# Altium footprint library std-th.PcbLib: 245 footprints (part 12 of 16)
Each footprint in its own frame and in the unit in brackets; x right, y up, seen from the top. Pads: shape width x height; smd on the part's side, far side on the other; paste and mask are expansions set on the pad; w line width, h text height; cw(c..) or ccw(c..) is an arc to the next point about the centre after c.
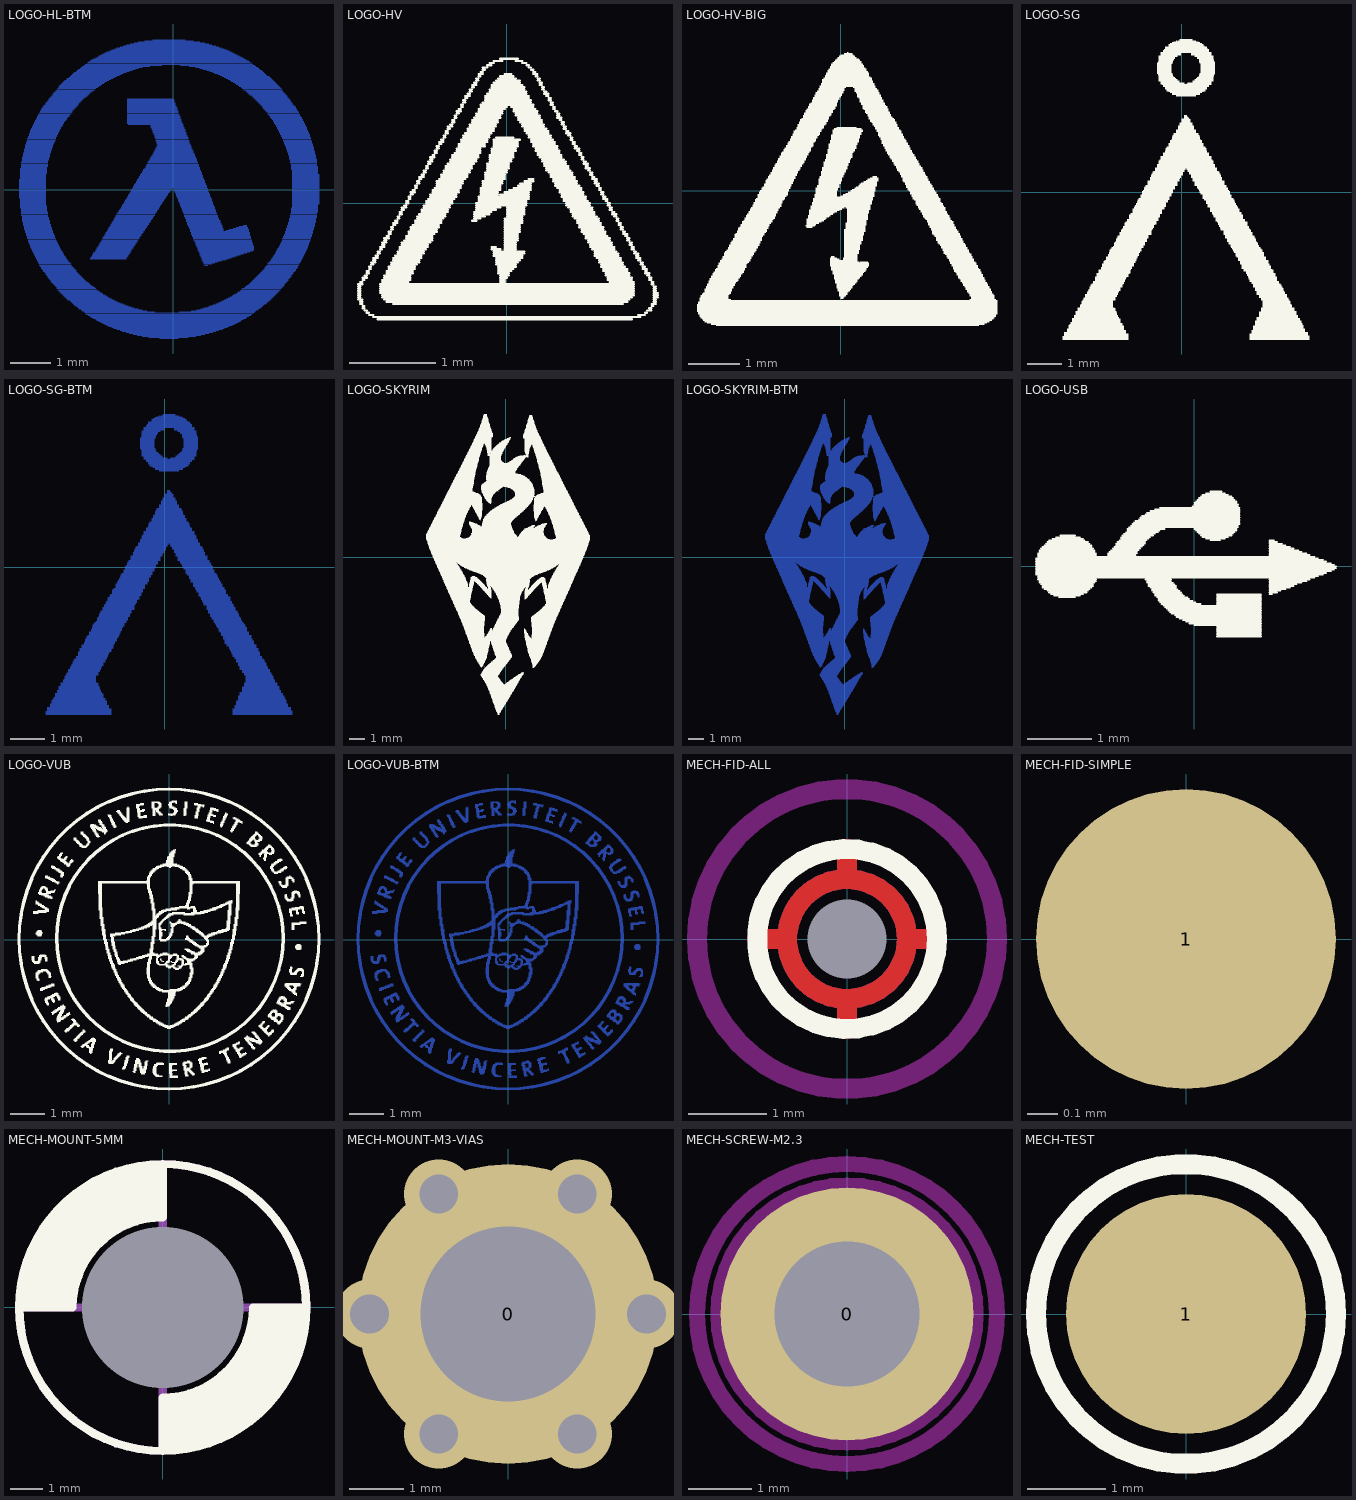
[diagram p11: the footprints below, top view; thin cyan lines are the x and y axes]

## LOGO-HL-BTM [mil] "Half Life Logo, 300 mil"
Bottom Layer:
  lines w1: -151,-8 -125,-8 ; -151,-7 -125,-7 ; -151,-6 -125,-6 ; -151,-5 -125,-5 ; -151,-4 -125,-4 ; -151,-3 -125,-3 ; -151,-2 -125,-2 ; -151,-1 -125,-1 ; -151,0 -125,0 ; -151,1 -125,1 ; -151,2 -125,2 ; -151,3 -125,3 ; -151,4 -125,4 ; -151,5 -125,5 ; -151,6 -125,6 ; -151,7 -125,7 ; -151,8 -125,8 ; -151,9 -125,9 ; -151,10 -125,10 ; -150,-18 -124,-18 ; -150,-17 -124,-17 ; -150,-16 -124,-16 ; -150,-15 -125,-15 ; -150,-14 -125,-14 ; -150,-13 -125,-13 ; -150,-12 -125,-12 ; -150,-11 -125,-11 ; -150,-10 -125,-10 ; -150,-9 -125,-9 ; -150,11 -125,11 ; -150,12 -125,12 ; -150,13 -125,13 ; -150,14 -125,14 ; -150,15 -125,15 ; -150,16 -124,16 ; -150,17 -124,17 ; -150,18 -124,18 ; -150,19 -124,19 ; -150,20 -124,20 ; -150,21 -124,21 ; -149,-25 -123,-25 ; -149,-24 -123,-24 ; -149,-23 -123,-23 ; -149,-22 -123,-22 ; -149,-21 -124,-21 ; -149,-20 -124,-20 ; -149,-19 -124,-19 ; -149,22 -124,22 ; -149,23 -123,23 ; -149,24 -123,24 ; -149,25 -123,25 ; -149,26 -123,26 ; -149,27 -123,27 ; -148,-31 -121,-31 ; -148,-30 -121,-30 ; -148,-29 -122,-29 ; -148,-28 -122,-28 ; -148,-27 -122,-27 ; -148,-26 -123,-26 ; -148,28 -123,28 ; -148,29 -122,29 ; -148,30 -122,30 ; -148,31 -122,31 ; -148,32 -121,32 ; -147,-35 -120,-35 ; -147,-34 -120,-34 ; -147,-33 -121,-33 ; -147,-32 -121,-32 ; -147,33 -121,33 ; -147,34 -121,34 ; -147,35 -121,35 ; -147,36 -120,36 ; -146,-39 -119,-39 ; -146,-38 -119,-38 ; -146,-37 -119,-37 ; -146,-36 -120,-36 ; -146,37 -120,37 ; -146,38 -120,38 ; -146,39 -119,39 ; -146,40 -119,40 ; -145,-42 -118,-42 ; -145,-41 -118,-41 ; -145,-40 -118,-40 ; -145,41 -119,41 ; -145,42 -118,42 ; -145,43 -118,43 ; -145,44 -118,44 ; -144,-45 -116,-45 ; -144,-44 -117,-44 ; -144,-43 -117,-43 ; -144,45 -117,45 ; -144,46 -117,46 ; -144,47 -116,47 ; -143,-48 -115,-48 ; -143,-47 -116,-47 ; -143,-46 -116,-46 ; -143,48 -116,48 ; -143,49 -115,49 ; -143,50 -115,50 ; -142,-51 -114,-51 ; -142,-50 -114,-50 ; -142,-49 -115,-49 ; -142,51 -115,51 ; -142,52 -114,52 ; -141,-53 -113,-53 ; -141,-52 -113,-52 ; -141,53 -114,53 ; -141,54 -113,54 ; -141,55 -113,55 ; -140,-56 -111,-56 ; -140,-55 -112,-55 ; -140,-54 -112,-54 ; -140,56 -112,56 ; -140,57 -112,57 ; -140,58 -111,58 ; -139,-58 -110,-58 ; -139,-57 -111,-57 ; -139,59 -111,59 ; -139,60 -110,60 ; -138,-60 -109,-60 ; -138,-59 -110,-59 ; -138,61 -110,61 ; -138,62 -109,62 ; -137,-62 -108,-62 ; -137,-61 -108,-61 ; -137,63 -108,63 ; -137,64 -108,64 ; -136,-64 -107,-64 ; -136,-63 -107,-63 ; -136,65 -107,65 ; -136,66 -107,66 ; -135,-66 -105,-66 ; -135,-65 -106,-65 ; -135,67 -106,67 ; -135,68 -105,68 ; -134,-68 -104,-68 ; -134,-67 -105,-67 ; -134,69 -104,69 ; -134,70 -104,70 ; -133,-70 -103,-70 ; -133,-69 -103,-69 ; -133,71 -103,71 ; -133,72 -102,72 ; -132,-72 -101,-72 ; -132,-71 -102,-71 ; -132,73 -102,73 ; -132,74 -101,74 ; -131,-74 -100,-74 ; -131,-73 -100,-73 ; -131,75 -100,75 ; -130,-75 -99,-75 ; -130,76 -99,76 ; -130,77 -99,77 ; -129,-77 -97,-77 ; -129,-76 -98,-76 ; -129,78 -98,78 ; -129,79 -97,79 ; -128,-78 -96,-78 ; -128,80 -96,80 ; -127,-80 -95,-80 ; -127,-79 -95,-79 ; -127,81 -95,81 ; -127,82 -94,82 ; -126,-81 -94,-81 ; -126,83 -93,83 ; -125,-83 -92,-83 ; -125,-82 -93,-82 ; -125,84 -93,84 ; -125,85 -92,85 ; -124,-84 -91,-84 ; -124,86 -91,86 ; -123,-86 -89,-86 ; -123,-85 -90,-85 ; -123,87 -90,87 ; -122,-87 -88,-87 ; -122,88 -89,88 ; -122,89 -88,89 ; -121,-88 -87,-88 ; -121,90 -87,90 ; -120,-90 -85,-90 ; -120,-89 -86,-89 ; -120,91 -85,91 ; -119,-91 -83,-91 ; -119,92 -84,92 ; -118,-92 -82,-92 ; -118,93 -83,93 ; -118,94 -82,94 ; -117,-93 -81,-93 ; -117,95 -81,95 ; -116,-94 -80,-94 ; -116,96 -80,96 ; -115,-95 -78,-95 ; -115,97 -78,97 ; -114,-97 -76,-97 ; -114,-96 -77,-96 ; -114,98 -77,98 ; -113,-98 -75,-98 ; -113,99 -76,99 ; -112,-99 -73,-99 ; -112,100 -74,100 ; -112,101 -73,101 ; -111,-100 -72,-100 ; -111,102 -71,102 ; -110,-101 -70,-101 ; -110,103 -70,103 ; -109,-102 -69,-102 ; -109,104 -68,104 ; -108,-103 -67,-103 ; -108,105 -67,105 ; -107,-104 -65,-104 ; -107,106 -65,106 ; -106,-105 -64,-105 ; -106,107 -63,107 ; -105,-106 -62,-106 ; -104,-107 -60,-107 ; -104,108 -61,108 ; -104,109 -59,109 ; -103,-108 -58,-108 ; -102,110 -57,110 ; -101,-109 -56,-109 ; -101,111 -55,111 ; -100,-110 -54,-110 ; -100,112 -53,112 ; -99,-111 -52,-111 ; -99,113 -51,113 ; -98,-112 -49,-112 ; -98,114 -49,114 ; -97,-113 -47,-113 ; -97,115 -46,115 ; -96,-114 -44,-114 ; -95,116 -43,116 ; -94,-115 -41,-115 ; -94,117 -40,117 ; -93,-116 -38,-116 ; -93,118 -37,118 ; -92,-117 -34,-117 ; -91,119 -34,119 ; -90,-118 -30,-118 ; -90,120 -30,120 ; -89,-119 -26,-119 ; -89,121 -23,121 ; -87,-120 -18,-120 ; -87,122 -11,122 ; -86,-121 79,-121 ; -86,123 78,123 ; -85,-122 77,-122 ; -84,124 77,124 ; -83,-123 76,-123 ; -83,125 75,125 ; -81,-124 74,-124 ; -81,-68 -46,-68 ; -81,-67 -46,-67 ; -81,126 74,126 ; -80,-125 72,-125 ; -80,-66 -45,-66 ; -80,127 72,127 ; -79,-65 -44,-65 ; -79,-64 -44,-64 ; -78,-126 71,-126 ; -78,-63 -43,-63 ; -78,-62 -42,-62 ; -78,128 70,128 ; -77,-61 -42,-61 ; -76,-127 69,-127 ; -76,-60 -41,-60 ; -76,-59 -41,-59 ; -76,129 69,129 ; -75,-128 67,-128 ; -75,-58 -40,-58 ; -75,-57 -39,-57 ; -74,-56 -39,-56 ; -74,130 67,130 ; -73,-129 66,-129 ; -73,-55 -38,-55 ; -73,-54 -37,-54 ; -73,131 65,131 ; -72,-53 -37,-53 ; -72,-52 -36,-52 ; -71,-130 64,-130 ; -71,-51 -35,-51 ; -71,132 63,132 ; -70,-50 -35,-50 ; -70,-49 -34,-49 ; -69,-131 62,-131 ; -69,-48 -33,-48 ; -69,-47 -33,-47 ; -69,133 61,133 ; -68,-46 -32,-46 ; -67,-132 60,-132 ; -67,-45 -31,-45 ; -67,-44 -31,-44 ; -67,134 59,134 ; -66,-43 -30,-43 ; -66,-42 -29,-42 ; -65,-133 58,-133 ; -65,-41 -29,-41 ; -65,135 57,135 ; -64,-40 -28,-40 ; -64,-39 -28,-39 ; -63,-134 55,-134 ; -63,-38 -27,-38 ; -63,-37 -26,-37 ; -62,-36 -26,-36 ; -62,136 55,136 ; -61,-35 -25,-35 ; -61,-34 -24,-34 ; -60,-135 53,-135 ; -60,-33 -24,-33 ; -60,-32 -23,-32 ; -60,137 53,137 ; -59,-31 -22,-31 ; -58,-136 50,-136 ; -58,-30 -22,-30 ; -58,-29 -21,-29 ; -57,-28 -20,-28 ; -57,-27 -20,-27 ; -57,138 50,138 ; -56,-26 -19,-26 ; -56,-25 -18,-25 ; -55,-137 48,-137 ; -55,-24 -18,-24 ; -55,139 47,139 ; -54,-23 -17,-23 ; -54,-22 -16,-22 ; -53,-21 -16,-21 ; -53,-20 -15,-20 ; -52,-138 45,-138 ; -52,-19 -14,-19 ; -52,140 45,140 ; -51,-18 -14,-18 ; -51,-17 -13,-17 ; -50,-139 42,-139 ; -50,-16 -13,-16 ; -50,-15 -12,-15 ; -49,-14 -11,-14 ; -49,141 42,141 ; -48,-13 -11,-13 ; -48,-12 -10,-12 ; -47,-11 -9,-11 ; -47,-10 -9,-10 ; -46,-140 39,-140 ; -46,-9 -8,-9 ; -46,142 38,142 ; -45,-8 -7,-8 ; -45,-7 -7,-7 ; -45,65 9,65 ; -45,66 9,66 ; -45,67 8,67 ; -45,68 8,68 ; -45,69 8,69 ; -45,70 7,70 ; -45,71 7,71 ; -45,72 7,72 ; -45,73 6,73 ; -45,74 6,74 ; -45,75 5,75 ; -45,76 5,76 ; -45,77 5,77 ; -45,78 4,78 ; -45,79 4,79 ; -45,80 4,80 ; -45,81 3,81 ; -45,82 3,82 ; -45,83 2,83 ; -45,84 2,84 ; -45,85 2,85 ; -45,86 1,86 ; -45,87 1,87 ; -45,88 1,88 ; -45,89 0,89 ; -44,-6 -6,-6 ; -44,-5 -5,-5 ; -44,64 10,64 ; -43,-141 35,-141 ; -43,-4 -5,-4 ; -42,-3 -4,-3 ; -42,-2 -3,-2 ; -42,143 35,143 ; -41,-1 -3,-1 ; -41,0 -2,0 ; -40,1 -1,1 ; -39,-142 31,-142 ; -39,2 33,2 ; -39,3 33,3 ; -38,4 33,4 ; -38,5 32,5 ; -38,144 31,144 ; -37,6 32,6 ; -36,7 31,7 ; -36,8 31,8 ; -35,-143 27,-143 ; -35,9 31,9 ; -35,10 30,10 ; -34,11 30,11 ; -34,145 26,145 ; -33,12 29,12 ; -33,13 29,13 ; -32,14 29,14 ; -32,15 28,15 ; -31,16 28,16 ; -30,-144 22,-144 ; -30,17 28,17 ; -30,18 27,18 ; -29,19 27,19 ; -29,20 26,20 ; -28,21 26,21 ; -28,146 20,146 ; -27,22 26,22 ; -27,23 25,23 ; -26,24 25,24 ; -26,25 25,25 ; -25,26 24,26 ; -25,27 24,27 ; -24,-145 15,-145 ; -24,28 23,28 ; -23,29 23,29 ; -23,30 23,30 ; -22,31 22,31 ; -22,32 22,32 ; -22,61 11,61 ; -22,62 10,62 ; -22,63 10,63 ; -21,33 21,33 ; -21,59 12,59 ; -21,60 11,60 ; -20,34 21,34 ; -20,35 21,35 ; -20,56 13,56 ; -20,57 12,57 ; -20,58 12,58 ; -20,147 12,147 ; -19,36 20,36 ; -19,37 20,37 ; -19,54 13,54 ; -19,55 13,55 ; -18,38 20,38 ; -18,39 19,39 ; -18,51 15,51 ; -18,52 14,52 ; -18,53 14,53 ; -17,40 19,40 ; -17,41 18,41 ; -17,48 16,48 ; -17,49 15,49 ; -17,50 15,50 ; -16,42 18,42 ; -16,43 18,43 ; -16,45 17,45 ; -16,46 16,46 ; -16,47 16,47 ; -15,44 17,44 ; -13,-146 5,-146 ; 1,-1 34,-1 ; 1,0 34,0 ; 1,1 34,1 ; 2,-3 35,-3 ; 2,-2 35,-2 ; 3,-6 36,-6 ; 3,-5 36,-5 ; 3,-4 36,-4 ; 4,-8 37,-8 ; 4,-7 37,-7 ; 5,-11 38,-11 ; 5,-10 38,-10 ; 5,-9 38,-9 ; 6,-120 80,-120 ; 6,-13 39,-13 ; 6,-12 39,-12 ; 7,-16 40,-16 ; 7,-15 40,-15 ; 7,-14 39,-14 ; 7,122 80,122 ; 8,-18 41,-18 ; 8,-17 41,-17 ; 9,-21 42,-21 ; 9,-20 42,-20 ; 9,-19 41,-19 ; 10,-23 43,-23 ; 10,-22 42,-22 ; 11,-26 44,-26 ; 11,-25 44,-25 ; 11,-24 43,-24 ; 12,-28 45,-28 ; 12,-27 44,-27 ; 13,-31 46,-31 ; 13,-30 46,-30 ; 13,-29 45,-29 ; 14,-34 47,-34 ; 14,-33 47,-33 ; 14,-32 46,-32 ; 15,-36 48,-36 ; 15,-35 48,-35 ; 16,-38 49,-38 ; 16,-37 48,-37 ; 16,121 81,121 ; 17,-41 74,-41 ; 17,-40 49,-40 ; 17,-39 49,-39 ; 18,-119 81,-119 ; 18,-44 75,-44 ; 18,-43 75,-43 ; 18,-42 75,-42 ; 19,-46 76,-46 ; 19,-45 75,-45 ; 20,-49 77,-49 ; 20,-48 76,-48 ; 20,-47 76,-47 ; 21,-51 77,-51 ; 21,-50 77,-50 ; 22,-54 78,-54 ; 22,-53 78,-53 ; 22,-52 78,-52 ; 22,120 83,120 ; 23,-118 83,-118 ; 23,-56 79,-56 ; 23,-55 79,-55 ; 24,-59 79,-59 ; 24,-58 79,-58 ; 24,-57 79,-57 ; 25,-61 75,-61 ; 25,-60 78,-60 ; 26,-64 66,-64 ; 26,-63 69,-63 ; 26,-62 72,-62 ; 26,119 84,119 ; 27,-117 84,-117 ; 27,-66 60,-66 ; 27,-65 63,-65 ; 28,-69 51,-69 ; 28,-68 54,-68 ; 28,-67 57,-67 ; 29,-71 44,-71 ; 29,-70 47,-70 ; 29,118 85,118 ; 30,-116 86,-116 ; 30,-73 38,-73 ; 30,-72 41,-72 ; 31,-74 34,-74 ; 33,117 87,117 ; 34,-115 87,-115 ; 36,-114 88,-114 ; 36,116 88,116 ; 39,-113 89,-113 ; 39,115 89,115 ; 41,114 90,114 ; 42,-112 91,-112 ; 44,-111 92,-111 ; 44,113 91,113 ; 46,-110 93,-110 ; 46,112 92,112 ; 48,-109 94,-109 ; 48,111 94,111 ; 50,-108 95,-108 ; 50,110 95,110 ; 52,-107 96,-107 ; 52,-40 74,-40 ; 52,109 96,109 ; 54,-106 97,-106 ; 54,108 97,108 ; 55,-39 74,-39 ; 56,-105 98,-105 ; 56,107 98,107 ; 57,106 99,106 ; 58,-104 99,-104 ; 59,-103 100,-103 ; 59,-38 73,-38 ; 59,105 100,105 ; 61,-102 101,-102 ; 61,104 101,104 ; 62,-37 73,-37 ; 62,103 102,103 ; 63,-101 102,-101 ; 64,-100 103,-100 ; 64,102 103,102 ; 65,-36 72,-36 ; 65,101 104,101 ; 66,-99 104,-99 ; 67,-98 105,-98 ; 67,100 105,100 ; 68,-97 106,-97 ; 68,99 106,99 ; 69,-35 72,-35 ; 69,98 107,98 ; 70,-96 107,-96 ; 71,-95 108,-95 ; 71,97 107,97 ; 72,-94 109,-94 ; 72,96 108,96 ; 73,95 109,95 ; 74,-93 109,-93 ; 74,94 110,94 ; 75,-92 110,-92 ; 75,93 111,93 ; 76,-91 111,-91 ; 77,-90 112,-90 ; 77,92 112,92 ; 78,-89 113,-89 ; 78,91 112,91 ; 79,-88 113,-88 ; 79,90 113,90 ; 80,-87 114,-87 ; 80,89 114,89 ; 81,-86 115,-86 ; 81,88 115,88 ; 82,-85 116,-85 ; 82,87 115,87 ; 83,-84 116,-84 ; 83,86 116,86 ; 84,-83 117,-83 ; 84,85 117,85 ; 85,-82 118,-82 ; 85,84 117,84 ; 86,-81 118,-81 ; 86,83 118,83 ; 87,-80 119,-80 ; 87,82 119,82 ; 88,-79 120,-79 ; 88,80 120,80 ; 88,81 120,81 ; 89,-78 120,-78 ; 89,79 121,79 ; 90,-77 121,-77 ; 90,-76 122,-76 ; 90,78 121,78 ; 91,-75 122,-75 ; 91,77 122,77 ; 92,-74 123,-74 ; 92,76 123,76 ; 93,-73 123,-73 ; 93,-72 124,-72 ; 93,74 124,74 ; 93,75 123,75 ; 94,-71 125,-71 ; 94,73 124,73 ; 95,-70 125,-70 ; 95,71 126,71 ; 95,72 125,72 ; 96,-69 126,-69 ; 96,-68 126,-68 ; 96,70 126,70 ; 97,-67 127,-67 ; 97,69 127,69 ; 98,-66 127,-66 ; 98,-65 128,-65 ; 98,67 128,67 ; 98,68 127,68 ; 99,-64 128,-64 ; 99,65 129,65 ; 99,66 128,66 ; 100,-63 129,-63 ; 100,-62 129,-62 ; 100,64 129,64 ; 101,-61 130,-61 ; 101,-60 130,-60 ; 101,62 130,62 ; 101,63 130,63 ; 102,-59 131,-59 ; 102,-58 131,-58 ; 102,60 131,60 ; 102,61 131,61 ; 103,-57 132,-57 ; 103,58 132,58 ; 103,59 131,59 ; 104,-56 132,-56 ; 104,-55 132,-55 ; 104,56 133,56 ; 104,57 132,57 ; 105,-54 133,-54 ; 105,-53 133,-53 ; 105,54 134,54 ; 105,55 133,55 ; 106,-52 133,-52 ; 106,-51 134,-51 ; 106,52 134,52 ; 106,53 134,53 ; 107,-50 134,-50 ; 107,-49 135,-49 ; 107,-48 135,-48 ; 107,50 135,50 ; 107,51 135,51 ; 108,-47 135,-47 ; 108,-46 136,-46 ; 108,48 136,48 ; 108,49 135,49 ; 109,-45 136,-45 ; 109,-44 136,-44 ; 109,45 137,45 ; 109,46 136,46 ; 109,47 136,47 ; 110,-43 137,-43 ; 110,-42 137,-42 ; 110,-41 137,-41 ; 110,43 137,43 ; 110,44 137,44 ; 111,-40 137,-40 ; 111,-39 138,-39 ; 111,-38 138,-38 ; 111,40 138,40 ; 111,41 138,41 ; 111,42 138,42 ; 112,-37 138,-37 ; 112,-36 139,-36 ; 112,-35 139,-35 ; 112,37 139,37 ; 112,38 139,38 ; 112,39 138,39 ; 113,-34 139,-34 ; 113,-33 139,-33 ; 113,-32 140,-32 ; 113,34 140,34 ; 113,35 139,35 ; 113,36 139,36 ; 114,-31 140,-31 ; 114,-30 140,-30 ; 114,-29 140,-29 ; 114,-28 140,-28 ; 114,30 141,30 ; 114,31 140,31 ; 114,32 140,32 ; 114,33 140,33 ; 115,-27 141,-27 ; 115,-26 141,-26 ; 115,-25 141,-25 ; 115,-24 141,-24 ; 115,26 141,26 ; 115,27 141,27 ; 115,28 141,28 ; 115,29 141,29 ; 116,-23 141,-23 ; 116,-22 142,-22 ; 116,-21 142,-21 ; 116,-20 142,-20 ; 116,-19 142,-19 ; 116,-18 142,-18 ; 116,20 142,20 ; 116,21 142,21 ; 116,22 142,22 ; 116,23 142,23 ; 116,24 141,24 ; 116,25 141,25 ; 117,-17 142,-17 ; 117,-16 142,-16 ; 117,-15 142,-15 ; 117,-14 143,-14 ; 117,-13 143,-13 ; 117,-12 143,-12 ; 117,-11 143,-11 ; 117,-10 143,-10 ; 117,-9 143,-9 ; 117,-8 143,-8 ; 117,-7 143,-7 ; 117,-6 143,-6 ; 117,-5 143,-5 ; 117,-4 143,-4 ; 117,-3 143,-3 ; 117,-2 143,-2 ; 117,-1 143,-1 ; 117,0 143,0 ; 117,1 143,1 ; 117,2 143,2 ; 117,3 143,3 ; 117,4 143,4 ; 117,5 143,5 ; 117,6 143,6 ; 117,7 143,7 ; 117,8 143,8 ; 117,9 143,9 ; 117,10 143,10 ; 117,11 143,11 ; 117,12 143,12 ; 117,13 143,13 ; 117,14 143,14 ; 117,15 143,15 ; 117,16 142,16 ; 117,17 142,17 ; 117,18 142,18 ; 117,19 142,19

## LOGO-HV [mil] "Logo, High Voltage"
Top Overlay:
  drawing of 508 lines, arcs and shapes, not listed

## LOGO-HV-BIG [mil] "High Voltage Warning Logo"
Top Overlay:
  drawing of 547 lines, arcs and shapes, not listed

## LOGO-SG [mil] "Stargate Logo, 300 mil"
Top Overlay:
  drawing of 556 lines, arcs and shapes, not listed

## LOGO-SG-BTM [mil] "Stargate Logo, 300 mil"
Bottom Layer:
  lines w1: -136,-168 -61,-168 ; -136,-167 -61,-167 ; -136,-166 -61,-166 ; -136,-165 -61,-165 ; -134,-164 -61,-164 ; -134,-163 -61,-163 ; -134,-162 -61,-162 ; -134,-161 -64,-161 ; -134,-160 -64,-160 ; -131,-159 -64,-159 ; -131,-158 -64,-158 ; -131,-157 -66,-157 ; -131,-156 -66,-156 ; -129,-155 -66,-155 ; -129,-154 -66,-154 ; -129,-153 -66,-153 ; -129,-152 -68,-152 ; -128,-151 -68,-151 ; -127,-150 -68,-150 ; -127,-149 -70,-149 ; -125,-148 -70,-148 ; -125,-147 -70,-147 ; -125,-146 -70,-146 ; -125,-145 -70,-145 ; -125,-144 -72,-144 ; -123,-143 -72,-143 ; -123,-142 -73,-142 ; -123,-141 -73,-141 ; -121,-140 -74,-140 ; -121,-139 -74,-139 ; -121,-138 -74,-138 ; -121,-137 -75,-137 ; -121,-136 -75,-136 ; -119,-135 -76,-135 ; -119,-134 -76,-134 ; -119,-133 -76,-133 ; -119,-132 -77,-132 ; -116,-131 -79,-131 ; -116,-130 -79,-130 ; -116,-129 -79,-129 ; -115,-128 -79,-128 ; -114,-127 -79,-127 ; -114,-126 -79,-126 ; -114,-125 -79,-125 ; -113,-124 -79,-124 ; -113,-123 -76,-123 ; -112,-122 -76,-122 ; -112,-121 -76,-121 ; -110,-120 -76,-120 ; -110,-119 -74,-119 ; -110,-118 -74,-118 ; -110,-117 -73,-117 ; -108,-116 -73,-116 ; -108,-115 -73,-115 ; -108,-114 -72,-114 ; -107,-113 -72,-113 ; -106,-112 -70,-112 ; -106,-111 -70,-111 ; -105,-110 -70,-110 ; -105,-109 -70,-109 ; -105,-108 -68,-108 ; -104,-107 -68,-107 ; -104,-106 -68,-106 ; -103,-105 -67,-105 ; -101,-104 -66,-104 ; -101,-103 -66,-103 ; -101,-102 -65,-102 ; -99,-101 -65,-101 ; -99,-100 -65,-100 ; -99,-99 -64,-99 ; -99,-98 -64,-98 ; -99,-97 -63,-97 ; -97,-96 -61,-96 ; -97,-95 -61,-95 ; -97,-94 -61,-94 ; -97,-93 -60,-93 ; -95,-92 -59,-92 ; -95,-91 -59,-91 ; -95,-90 -59,-90 ; -95,-89 -59,-89 ; -92,-88 -58,-88 ; -92,-87 -57,-87 ; -92,-86 -57,-86 ; -91,-85 -57,-85 ; -91,-84 -55,-84 ; -91,-83 -55,-83 ; -91,-82 -55,-82 ; -89,-81 -55,-81 ; -89,-80 -53,-80 ; -89,-79 -53,-79 ; -88,-78 -52,-78 ; -86,-77 -52,-77 ; -86,-76 -52,-76 ; -86,-75 -51,-75 ; -86,-74 -51,-74 ; -84,-73 -50,-73 ; -84,-72 -49,-72 ; -84,-71 -49,-71 ; -83,-70 -49,-70 ; -83,-69 -48,-69 ; -82,-68 -48,-68 ; -82,-67 -46,-67 ; -82,-66 -46,-66 ; -81,-65 -46,-65 ; -80,-64 -46,-64 ; -80,-63 -44,-63 ; -78,-62 -44,-62 ; -77,-61 -44,-61 ; -77,-60 -42,-60 ; -77,-59 -42,-59 ; -77,-58 -42,-58 ; -76,-57 -42,-57 ; -75,-56 -40,-56 ; -75,-55 -40,-55 ; -75,-54 -40,-54 ; -74,-53 -40,-53 ; -74,-52 -38,-52 ; -73,-51 -38,-51 ; -73,-50 -38,-50 ; -71,-49 -38,-49 ; -71,-48 -35,-48 ; -71,-47 -35,-47 ; -71,-46 -35,-46 ; -69,-45 -35,-45 ; -69,-44 -35,-44 ; -69,-43 -34,-43 ; -68,-42 -33,-42 ; -67,-41 -33,-41 ; -67,-40 -32,-40 ; -67,-39 -32,-39 ; -65,-38 -32,-38 ; -65,-37 -31,-37 ; -65,-36 -29,-36 ; -65,-35 -29,-35 ; -64,-34 -29,-34 ; -62,-33 -29,-33 ; -62,-32 -27,-32 ; -62,-31 -27,-31 ; -60,-30 -27,-30 ; -60,-29 -27,-29 ; -60,-28 -25,-28 ; -60,-27 -25,-27 ; -60,-26 -25,-26 ; -58,-25 -25,-25 ; -58,-24 -23,-24 ; -56,-23 -23,-23 ; -56,-22 -23,-22 ; -56,-21 -23,-21 ; -56,-20 -23,-20 ; -56,-19 -20,-19 ; -54,-18 -20,-18 ; -54,-17 -20,-17 ; -53,-16 -18,-16 ; -53,-15 -18,-15 ; -52,-14 -18,-14 ; -52,-13 -18,-13 ; -51,-12 -18,-12 ; -51,-11 -16,-11 ; -50,-10 -16,-10 ; -50,-9 -16,-9 ; -49,-8 -14,-8 ; -49,-7 -14,-7 ; -47,-6 -14,-6 ; -47,-5 -14,-5 ; -47,-4 -12,-4 ; -47,-3 -12,-3 ; -45,-2 -12,-2 ; -45,-1 -11,-1 ; -45,0 -10,0 ; -45,1 -10,1 ; -44,2 -10,2 ; -43,3 -10,3 ; -43,4 -8,4 ; -43,5 -8,5 ; -42,6 -8,6 ; -41,7 -8,7 ; -41,8 -5,8 ; -39,9 -5,9 ; -39,10 -5,10 ; -39,11 -5,11 ; -39,12 -5,12 ; -39,13 -3,13 ; -36,14 -3,14 ; -36,15 -3,15 ; -36,16 -2,16 ; -36,17 -1,17 ; -35,18 -1,18 ; -35,19 -1,19 ; -34,20 1,20 ; -34,21 1,21 ; -33,22 1,22 ; -33,23 1,23 ; -32,24 3,24 ; -30,25 3,25 ; -30,26 4,26 ; -30,27 4,27 ; -30,28 40,28 ; -28,29 38,29 ; -28,30 38,30 ; -28,31 38,31 ; -28,32 38,32 ; -28,136 -11,136 ; -28,137 -12,137 ; -28,138 -12,138 ; -28,139 -12,139 ; -28,140 -12,140 ; -28,141 -12,141 ; -28,142 -12,142 ; -28,143 -12,143 ; -28,144 -12,144 ; -28,145 -12,145 ; -28,146 -12,146 ; -28,147 -11,147 ; -28,148 -11,148 ; -27,134 -10,134 ; -27,135 -11,135 ; -27,149 -10,149 ; -26,33 36,33 ; -26,34 36,34 ; -26,35 36,35 ; -26,36 36,36 ; -26,127 -3,127 ; -26,128 -5,128 ; -26,129 -5,129 ; -26,130 -7,130 ; -26,131 -8,131 ; -26,132 -9,132 ; -26,133 -10,133 ; -26,150 -10,150 ; -26,151 -9,151 ; -26,152 -9,152 ; -26,153 -8,153 ; -26,154 -8,154 ; -26,155 -5,155 ; -26,156 -5,156 ; -25,37 35,37 ; -24,38 34,38 ; -24,39 34,39 ; -24,40 34,40 ; -24,41 34,41 ; -24,124 3,124 ; -24,125 3,125 ; -24,126 -3,126 ; -24,157 -1,157 ; -24,158 -1,158 ; -24,159 -1,159 ; -24,160 34,160 ; -22,123 34,123 ; -21,42 31,42 ; -21,43 31,43 ; -21,44 31,44 ; -21,45 31,45 ; -21,121 31,121 ; -21,122 31,122 ; -21,161 31,161 ; -21,162 31,162 ; -20,163 31,163 ; -19,46 29,46 ; -19,47 29,47 ; -19,118 29,118 ; -19,119 29,119 ; -19,120 29,120 ; -19,164 30,164 ; -19,165 29,165 ; -19,166 29,166 ; -18,48 28,48 ; -18,49 28,49 ; -18,50 28,50 ; -17,51 27,51 ; -17,52 27,52 ; -17,116 27,116 ; -17,117 27,117 ; -15,53 25,53 ; -15,54 25,54 ; -15,55 25,55 ; -15,56 25,56 ; -15,115 25,115 ; -15,167 26,167 ; -15,168 25,168 ; -15,169 25,169 ; -13,57 23,57 ; -13,58 23,58 ; -13,59 23,59 ; -13,114 23,114 ; -13,170 23,170 ; -12,60 22,60 ; -11,61 21,61 ; -11,62 21,62 ; -11,63 21,63 ; -11,112 21,112 ; -11,113 21,113 ; -11,171 21,171 ; -10,64 20,64 ; -10,65 20,65 ; -9,66 19,66 ; -9,67 19,67 ; -9,172 19,172 ; -6,68 16,68 ; -6,69 16,69 ; -6,70 16,70 ; -6,71 16,71 ; -6,110 16,110 ; -6,111 16,111 ; -6,173 -5,173 ; -4,72 14,72 ; -4,73 14,73 ; -4,74 14,74 ; -4,75 14,75 ; -4,76 14,76 ; -4,173 16,173 ; -2,77 12,77 ; -2,78 12,78 ; -2,79 12,79 ; -2,174 12,174 ; -2,175 12,175 ; 0,80 10,80 ; 0,81 10,81 ; 0,82 10,82 ; 0,83 10,83 ; 0,84 9,84 ; 3,85 8,85 ; 3,86 7,86 ; 3,87 6,87 ; 3,88 6,88 ; 6,26 40,26 ; 6,27 40,27 ; 6,124 34,124 ; 7,24 42,24 ; 7,25 40,25 ; 7,125 34,125 ; 9,21 44,21 ; 9,22 43,22 ; 9,23 43,23 ; 11,17 46,17 ; 11,18 45,18 ; 11,19 45,19 ; 11,20 44,20 ; 11,157 34,157 ; 11,158 34,158 ; 11,159 34,159 ; 13,13 49,13 ; 13,14 46,14 ; 13,15 46,15 ; 13,16 46,16 ; 13,126 34,126 ; 13,127 36,127 ; 15,8 51,8 ; 15,9 49,9 ; 15,10 49,10 ; 15,11 49,11 ; 15,12 49,12 ; 15,128 36,128 ; 15,129 36,129 ; 15,155 36,155 ; 15,156 36,156 ; 17,130 36,130 ; 18,5 53,5 ; 18,6 51,6 ; 18,7 51,7 ; 18,131 36,131 ; 18,153 36,153 ; 18,154 36,154 ; 19,4 53,4 ; 19,132 36,132 ; 20,2 54,2 ; 20,3 53,3 ; 20,133 37,133 ; 20,134 37,134 ; 20,149 38,149 ; 20,150 37,150 ; 20,151 37,151 ; 20,152 36,152 ; 21,0 55,0 ; 21,1 55,1 ; 21,135 38,135 ; 21,136 38,136 ; 21,148 38,148 ; 22,-2 55,-2 ; 22,-1 55,-1 ; 22,137 38,137 ; 22,138 38,138 ; 22,139 38,139 ; 22,140 38,140 ; 22,141 38,141 ; 22,142 38,142 ; 22,143 38,143 ; 22,144 38,144 ; 22,145 38,145 ; 22,146 38,146 ; 22,147 38,147 ; 24,-7 59,-7 ; 24,-6 57,-6 ; 24,-5 57,-5 ; 24,-4 57,-4 ; 24,-3 57,-3 ; 26,-9 60,-9 ; 26,-8 59,-8 ; 28,-13 62,-13 ; 28,-12 61,-12 ; 28,-11 61,-11 ; 28,-10 60,-10 ; 30,-17 64,-17 ; 30,-16 63,-16 ; 30,-15 63,-15 ; 30,-14 62,-14 ; 33,-22 66,-22 ; 33,-21 66,-21 ; 33,-20 66,-20 ; 33,-19 66,-19 ; 33,-18 64,-18 ; 35,-25 68,-25 ; 35,-24 68,-24 ; 35,-23 68,-23 ; 36,-26 70,-26 ; 37,-28 70,-28 ; 37,-27 70,-27 ; 39,-33 72,-33 ; 39,-32 72,-32 ; 39,-31 72,-31 ; 39,-30 70,-30 ; 39,-29 70,-29 ; 41,-34 75,-34 ; 42,-37 75,-37 ; 42,-36 75,-36 ; 42,-35 75,-35 ; 43,-39 77,-39 ; 43,-38 75,-38 ; 44,-41 77,-41 ; 44,-40 77,-40 ; 45,-43 79,-43 ; 45,-42 78,-42 ; 48,-48 81,-48 ; 48,-47 81,-47 ; 48,-46 81,-46 ; 48,-45 79,-45 ; 48,-44 79,-44 ; 50,-52 84,-52 ; 50,-51 83,-51 ; 50,-50 83,-50 ; 50,-49 81,-49 ; 52,-56 85,-56 ; 52,-55 85,-55 ; 52,-54 85,-54 ; 52,-53 84,-53 ; 54,-59 87,-59 ; 54,-58 87,-58 ; 54,-57 86,-57 ; 56,-62 88,-62 ; 56,-61 88,-61 ; 56,-60 87,-60 ; 57,-63 90,-63 ; 58,-65 91,-65 ; 58,-64 90,-64 ; 59,-67 92,-67 ; 59,-66 92,-66 ; 60,-69 94,-69 ; 60,-68 92,-68 ; 62,-73 94,-73 ; 62,-72 94,-72 ; 62,-71 94,-71 ; 62,-70 94,-70 ; 63,-74 96,-74 ; 65,-78 99,-78 ; 65,-77 96,-77 ; 65,-76 96,-76 ; 65,-75 96,-75 ; 67,-82 100,-82 ; 67,-81 99,-81 ; 67,-80 99,-80 ; 67,-79 99,-79 ; 69,-87 102,-87 ; 69,-86 102,-86 ; 69,-85 102,-85 ; 69,-84 102,-84 ; 69,-83 100,-83 ; 71,-90 105,-90 ; 71,-89 105,-89 ; 71,-88 103,-88 ; 74,-93 107,-93 ; 74,-92 105,-92 ; 74,-91 105,-91 ; 75,-95 107,-95 ; 75,-94 107,-94 ; 76,-97 109,-97 ; 76,-96 107,-96 ; 77,-99 109,-99 ; 77,-98 109,-98 ; 78,-168 146,-168 ; 78,-167 146,-167 ; 78,-166 146,-166 ; 78,-165 146,-165 ; 78,-164 146,-164 ; 78,-163 144,-163 ; 78,-162 144,-162 ; 78,-102 111,-102 ; 78,-101 109,-101 ; 78,-100 109,-100 ; 80,-161 144,-161 ; 80,-160 144,-160 ; 80,-159 141,-159 ; 80,-158 141,-158 ; 80,-104 111,-104 ; 80,-103 111,-103 ; 82,-157 141,-157 ; 82,-156 141,-156 ; 82,-155 139,-155 ; 82,-154 139,-154 ; 82,-153 139,-153 ; 82,-108 115,-108 ; 82,-107 114,-107 ; 82,-106 114,-106 ; 82,-105 113,-105 ; 84,-152 139,-152 ; 84,-151 138,-151 ; 84,-150 138,-150 ; 84,-149 137,-149 ; 84,-148 137,-148 ; 84,-147 137,-147 ; 84,-112 116,-112 ; 84,-111 116,-111 ; 84,-110 116,-110 ; 84,-109 115,-109 ; 86,-146 135,-146 ; 86,-145 135,-145 ; 86,-144 135,-144 ; 86,-143 133,-143 ; 86,-117 120,-117 ; 86,-116 118,-116 ; 86,-115 118,-115 ; 86,-114 118,-114 ; 86,-113 117,-113 ; 89,-142 133,-142 ; 89,-141 133,-141 ; 89,-140 131,-140 ; 89,-139 131,-139 ; 89,-138 131,-138 ; 89,-137 131,-137 ; 89,-120 120,-120 ; 89,-119 120,-119 ; 89,-118 120,-118 ; 91,-136 131,-136 ; 91,-135 129,-135 ; 91,-134 129,-134 ; 91,-133 129,-133 ; 91,-132 129,-132 ; 91,-123 123,-123 ; 91,-122 122,-122 ; 91,-121 122,-121 ; 93,-131 126,-131 ; 93,-130 126,-130 ; 93,-129 126,-129 ; 93,-128 125,-128 ; 93,-127 124,-127 ; 93,-126 124,-126 ; 93,-125 124,-125 ; 93,-124 123,-124

## LOGO-SKYRIM [mil] "Skyrim Logo, 700 mil"
Top Overlay:
  drawing of 2500 lines, arcs and shapes, not listed

## LOGO-SKYRIM-BTM [mil] "Skyrim Logo, 700 mil"
Bottom Layer:
  drawing of 2500 lines, arcs and shapes, not listed

## LOGO-USB [mil] "USB Logo, 200 mil"
Top Overlay:
  lines w1: -97,-5 79,-5 ; -97,-4 81,-4 ; -97,-3 84,-3 ; -97,-2 86,-2 ; -97,-1 87,-1 ; -97,0 87,0 ; -97,1 86,1 ; -97,2 84,2 ; -97,3 81,3 ; -97,4 79,4 ; -97,5 76,5 ; -96,-8 -60,-8 ; -96,-7 74,-7 ; -96,-6 76,-6 ; -96,6 74,6 ; -96,7 -60,7 ; -96,8 -60,8 ; -95,-10 -61,-10 ; -95,-9 -60,-9 ; -95,9 -61,9 ; -95,10 -61,10 ; -94,-11 -62,-11 ; -94,11 -62,11 ; -93,-13 -63,-13 ; -93,-12 -62,-12 ; -93,12 -63,12 ; -92,-14 -64,-14 ; -92,13 -63,13 ; -91,14 -64,14 ; -90,-15 -65,-15 ; -90,15 -65,15 ; -89,-16 -66,-16 ; -89,16 -67,16 ; -88,-17 -68,-17 ; -87,17 -68,17 ; -86,-18 -70,-18 ; -85,18 -70,18 ; -83,-19 -73,-19 ; -82,19 -73,19 ; -53,7 -36,7 ; -53,8 -35,8 ; -52,9 -35,9 ; -51,10 -34,10 ; -50,11 -33,11 ; -49,12 -32,12 ; -48,13 -31,13 ; -48,14 -30,14 ; -47,15 -30,15 ; -46,16 -29,16 ; -45,17 -28,17 ; -45,18 -27,18 ; -44,19 -25,19 ; -43,20 -24,20 ; -42,21 -22,21 ; -41,22 -21,22 ; -41,23 -18,23 ; -40,24 27,24 ; -39,25 27,25 ; -38,26 28,26 ; -37,27 28,27 ; -36,28 28,28 ; -34,29 28,29 ; -33,30 28,30 ; -32,31 28,31 ; -30,-8 -14,-8 ; -30,32 28,32 ; -29,-10 -13,-10 ; -29,-9 -14,-9 ; -29,33 28,33 ; -28,-12 -11,-12 ; -28,-11 -12,-11 ; -27,-13 -11,-13 ; -27,34 28,34 ; -26,-15 -9,-15 ; -26,-14 -10,-14 ; -25,-16 -8,-16 ; -24,-18 -6,-18 ; -24,-17 -7,-17 ; -24,35 28,35 ; -23,-19 -4,-19 ; -22,-21 -1,-21 ; -22,-20 -3,-20 ; -21,-22 1,-22 ; -21,36 28,36 ; -20,-23 4,-23 ; -19,-24 41,-24 ; -18,-25 41,-25 ; -17,-26 41,-26 ; -16,-27 41,-27 ; -15,-28 41,-28 ; -14,-29 41,-29 ; -12,-30 41,-30 ; -11,-31 41,-31 ; -9,-32 41,-32 ; -7,-33 41,-33 ; -5,-34 41,-34 ; -3,-35 41,-35 ; -1,37 27,37 ; 0,-36 41,-36 ; 0,23 26,23 ; 0,38 27,38 ; 0,39 26,39 ; 1,22 26,22 ; 1,40 26,40 ; 2,21 25,21 ; 2,41 25,41 ; 3,20 24,20 ; 3,42 24,42 ; 4,19 23,19 ; 4,43 23,43 ; 5,18 21,18 ; 5,44 21,44 ; 7,17 19,17 ; 7,45 19,45 ; 10,16 16,16 ; 10,46 17,46 ; 14,-43 41,-43 ; 14,-42 41,-42 ; 14,-41 41,-41 ; 14,-40 41,-40 ; 14,-39 41,-39 ; 14,-38 41,-38 ; 14,-37 41,-37 ; 14,-23 41,-23 ; 14,-22 41,-22 ; 14,-21 41,-21 ; 14,-20 41,-20 ; 14,-19 41,-19 ; 14,-18 41,-18 ; 14,-17 41,-17 ; 46,-17 48,-17 ; 46,-16 51,-16 ; 46,-15 53,-15 ; 46,-14 56,-14 ; 46,-13 59,-13 ; 46,-12 61,-12 ; 46,-11 63,-11 ; 46,-10 66,-10 ; 46,-9 69,-9 ; 46,-8 71,-8 ; 46,7 71,7 ; 46,8 69,8 ; 46,9 66,9 ; 46,10 64,10 ; 46,11 61,11 ; 46,12 59,12 ; 46,13 56,13 ; 46,14 54,14 ; 46,15 51,15 ; 46,16 49,16

## LOGO-VUB [mil] "VUB logo, 9 mm"
Top Overlay:
  drawing of 1971 lines, arcs and shapes, not listed

## LOGO-VUB-BTM [mil] "VUB logo, 9 mm"
Bottom Layer:
  drawing of 1971 lines, arcs and shapes, not listed

## MECH-FID-ALL [mm]
pads (1):
  round 0 hole 1 unplated: 0(0,0)
Top Layer:
  circle w0.254: c0,0 r0.762
  lines w0.254: -1.143,0 -0.762,0 ; 0,-1.143 0,-0.762 ; 0,0.762 0,1.143 ; 0.762,0 1.143,0
Bottom Layer:
  circle w0.254: c0,0 r0.762
  lines w0.254: -1.143,0 -0.762,0 ; 0,-1.143 0,-0.762 ; 0,0.762 0,1.143 ; 0.762,0 1.143,0
Top Overlay:
  circle w0.254: c0,0 r1.143
Bottom Overlay:
  circle w0.254: c0,0 r1.143
Top Paste:
  circle w0.254: c0,0 r0.762
Bottom Paste:
  circle w0.254: c0,0 r0.762
Top Solder:
  circle w0.254: c0,0 r1.524
  circle w0.254: c0,0 r0.762
  lines w0.254: -1.016,-1.016 -0.635,-0.635 ; -1.016,1.016 -0.635,0.635 ; 0.635,-0.635 1.016,-1.016 ; 0.635,0.635 1.016,1.016
Bottom Solder:
  circle w0.254: c0,0 r0.762
  circle w0.254: c0,0 r1.524
  lines w0.254: -1.016,-1.016 -0.635,-0.635 ; -1.016,1.016 -0.635,0.635 ; 0.635,-0.635 1.016,-1.016 ; 0.635,0.635 1.016,1.016
Keep-Out Layer:
  circle w0.254: c0,0 r1.905

## MECH-FID-SIMPLE [mil] "Fiducial Mark, 1 mm"
pads (1):
  round 39.4 smd paste+0 mask+39.4: 1(0,0)

## MECH-MOUNT-5MM [mm] "Mounting hole, 5 mm"
pads (1):
  round 0 hole 5: 3(0,0)
Top Overlay:
  circle w0.254: c0,0 r4.445
  region: 2.794,0 4.445,0 4.445,-0.762 2.794,-0.762
  region: 0,-2.794 0.762,-2.794 0.762,-4.318 0.635,-4.445 0,-4.445
  region: -4.445,0 -2.794,0 -2.794,0.889 -2.921,0.762 -4.318,0.762
  region: 0,2.794 -0.889,2.794 -0.635,3.048 -0.635,4.445 0,4.445
  lines w0.254: -4.445,0 -2.794,0 cw(c0,0) 0,2.794 0,4.445 ; 0,-4.445 0,-2.794 ccw(c0,0) 2.794,0 4.455,0
  lines w1.524: -3.622,0.749 cw(c0.51,-0.524) -0.65,3.641 ; 0.768,-3.584 ccw(c0,0) 3.578,-0.795
Mechanical 15:
  lines w0.254: 0,0 0,4.445 cw(c0,0) 4.445,0 0,0 ; 0,0 -4.445,0 ccw(c0,0) 0,-4.445 0,0

## MECH-MOUNT-M3-VIAS [mm] "Mounting hole, M3, relief vias"
pads (1):
  round 5.5 hole 3.2 unplated: 0(0,0)
via 1.27,2.2 diameter 1.27 hole 0.711
via 2.54,0 diameter 1.27 hole 0.711
via 1.27,-2.2 diameter 1.27 hole 0.711
via -2.54,0 diameter 1.27 hole 0.711
via -1.27,2.2 diameter 1.27 hole 0.711
via -1.27,-2.2 diameter 1.27 hole 0.711
Keep-Out Layer:
  circle w0.254: c0,0 r2.036
  circle w0.254: c0,0 r2.373

## MECH-SCREW-M2.3 [mm] "Screw M2.3"
height 3
pads (1):
  round 4 hole 2.3 unplated: 0(0,0)
Keep-Out Layer:
  circle w0.254: c0,0 r2.373
  circle w0.254: c0,0 r2.036
3D body: height 2, standoff -4, extent -1.9,-1.9 1.9,1.9

## MECH-TEST [mil] "Test pad, 4 mm"
pads (1):
  round 120 smd paste-3937.01: 1(0,0)
Top Overlay:
  circle w10: c0,0 r75